# Altium schematic symbol library IC.SchLib: 555 symbols (part 2 of 15) (continued)
## AT25128AN_10SU_1.8 (continued)
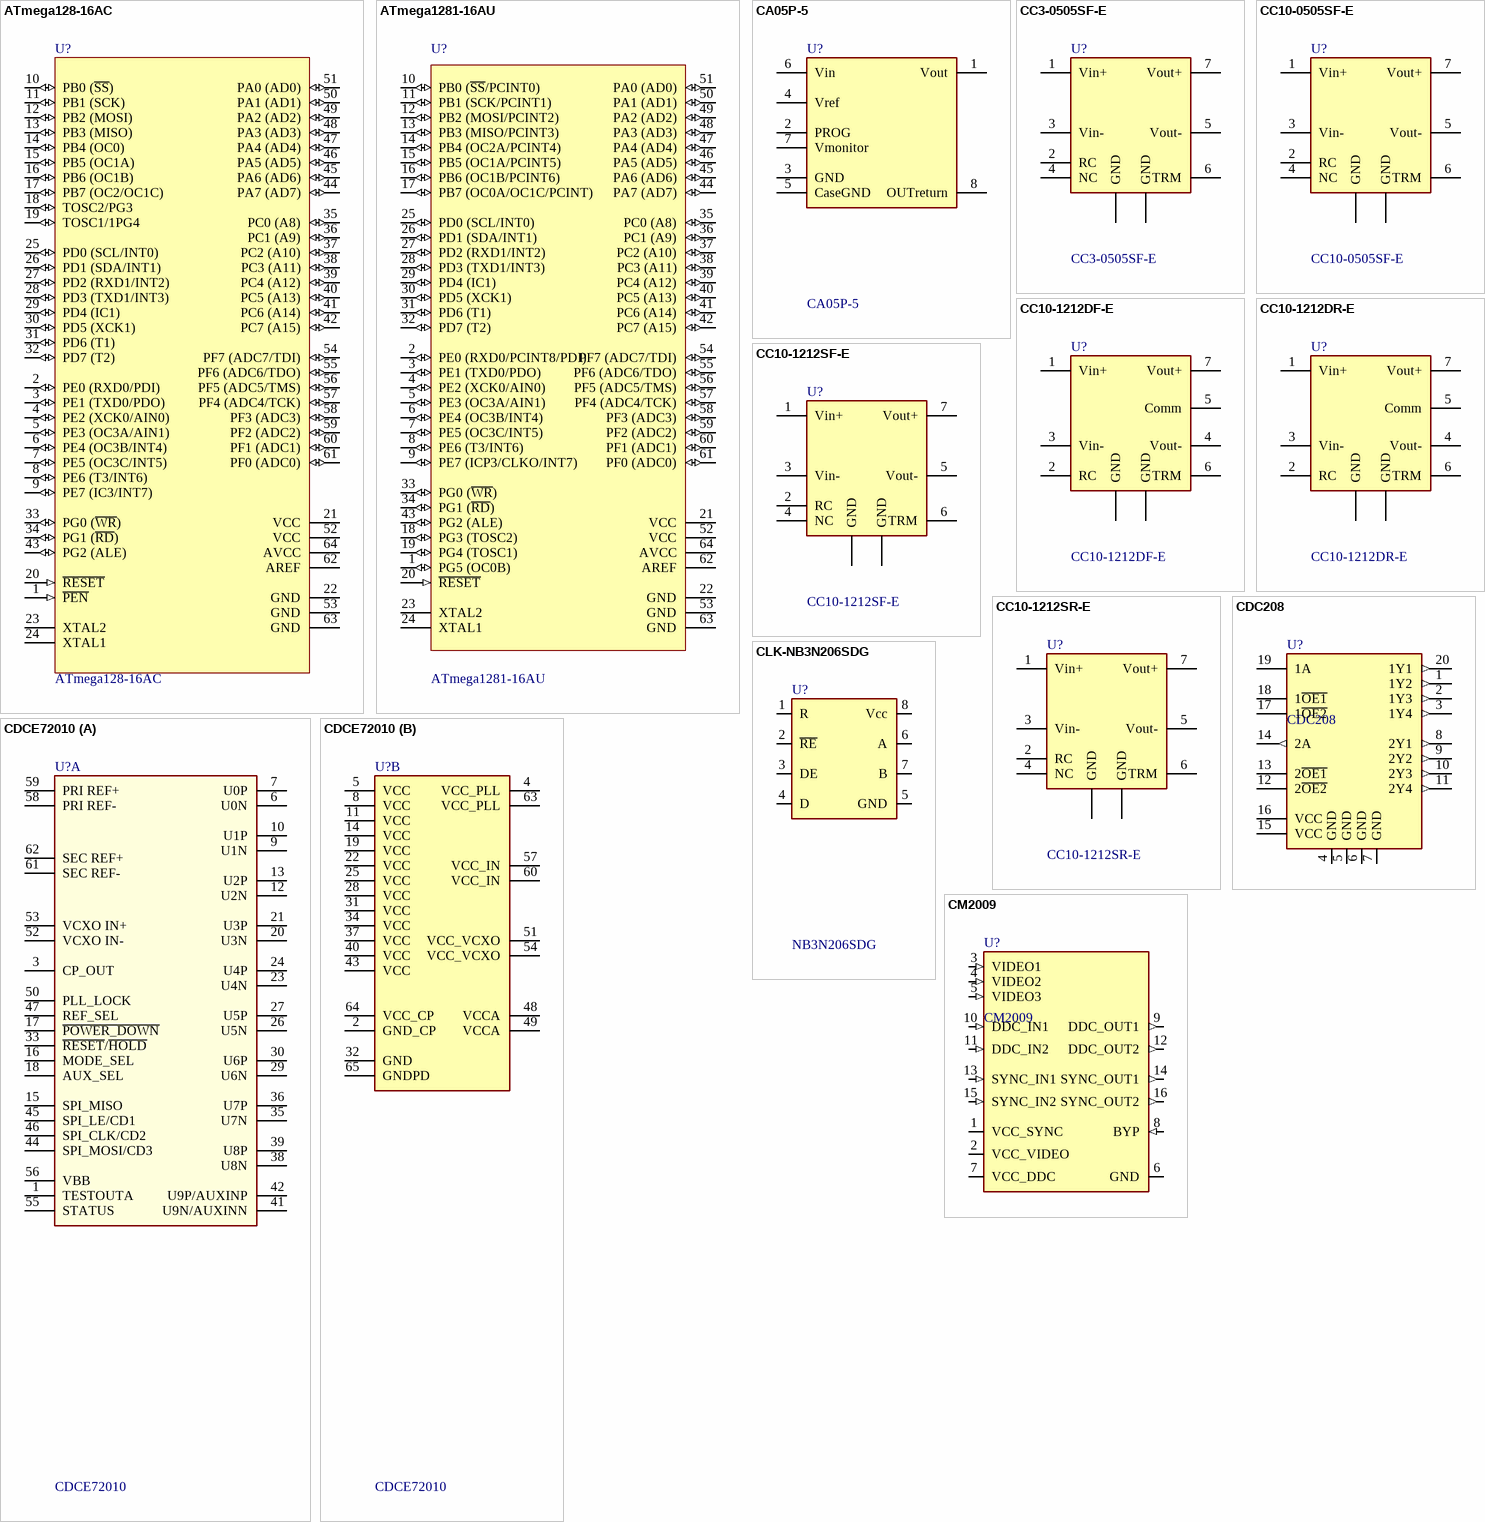
[diagram p8: symbols ATmega128-16AC to CM2009]

## ATmega128-16AC
designator U?
8-Bit AVR Microcontroller with 128K Bytes of In-System Programmable Flash Memory; Manufacturer: Atmel; Sort: 510; Tech: SMDR; Package: TQFP64; Manufacturer No: ATmega128-16AC; Price: 0
3D model ATMEGA128-64A (64-Pin Thin Quad Flat Pack 0.8 mm Pitch)
footprint TQFP64A (TQFP, 64-Leads, Body 16,0x16,0mm (max), Pitch 0,80mm, IPC Medium Density)
pins: 1 ~{PEN} (in), 2 PE0 (RXD0/PDI) (io), 3 PE1 (TXD0/PDO) (io), 4 PE2 (XCK0/AIN0) (io), 5 PE3 (OC3A/AIN1) (io), 6 PE4 (OC3B/INT4) (io), 7 PE5 (OC3C/INT5) (io), 8 PE6 (T3/INT6) (io), 9 PE7 (IC3/INT7) (io), 10 PB0 (~{SS}) (io), 11 PB1 (SCK) (io), 12 PB2 (MOSI) (io), 13 PB3 (MISO) (io), 14 PB4 (OC0) (io), 15 PB5 (OC1A) (io), 16 PB6 (OC1B) (io), 17 PB7 (OC2/OC1C) (io), 18 TOSC2/PG3 (io), 19 TOSC1/1PG4 (io), 20 ~{RESET} (in), 21 VCC (power), 22 GND (power), 23 XTAL2, 24 XTAL1, 25 PD0 (SCL/INT0) (io), 26 PD1 (SDA/INT1) (io), 27 PD2 (RXD1/INT2) (io), 28 PD3 (TXD1/INT3) (io), 29 PD4 (IC1) (io), 30 PD5 (XCK1) (io), 31 PD6 (T1) (io), 32 PD7 (T2) (io), 33 PG0 (~{WR}) (io), 34 PG1 (~{RD}) (io), 35 PC0 (A8) (io), 36 PC1 (A9) (io), 37 PC2 (A10) (io), 38 PC3 (A11) (io), 39 PC4 (A12) (io), 40 PC5 (A13) (io), 41 PC6 (A14) (io), 42 PC7 (A15) (io), 43 PG2 (ALE) (io), 44 PA7 (AD7) (io), 45 PA6 (AD6) (io), 46 PA5 (AD5) (io), 47 PA4 (AD4) (io), 48 PA3 (AD3) (io), 49 PA2 (AD2) (io), 50 PA1 (AD1) (io), 51 PA0 (AD0) (io), 52 VCC (power), 53 GND (power), 54 PF7 (ADC7/TDI) (io), 55 PF6 (ADC6/TDO) (io), 56 PF5 (ADC5/TMS) (io), 57 PF4 (ADC4/TCK) (io), 58 PF3 (ADC3) (io), 59 PF2 (ADC2) (io), 60 PF1 (ADC1) (io), 61 PF0 (ADC0) (io), 62 AREF, 63 GND (power), 64 AVCC (power)

## ATmega1281-16AU
designator U?
8-Bit AVR Microcontroller with 128K Bytes of In-System Programmable Flash Memory; Manufacturer: Atmel; Sort: 510; Tech: SMDR; Package: TQFP64; Manufacturer No: ATmega1281-16AU; Price: 0
3D model ATMEGA128-64A (64-Pin Thin Quad Flat Pack 0.8 mm Pitch)
footprint TQFP64A (TQFP, 64-Leads, Body 16,0x16,0mm (max), Pitch 0,80mm, IPC Medium Density)
pins: 1 PG5 (OC0B) (io), 2 PE0 (RXD0/PCINT8/PDI) (io), 3 PE1 (TXD0/PDO) (io), 4 PE2 (XCK0/AIN0) (io), 5 PE3 (OC3A/AIN1) (io), 6 PE4 (OC3B/INT4) (io), 7 PE5 (OC3C/INT5) (io), 8 PE6 (T3/INT6) (io), 9 PE7 (ICP3/CLKO/INT7) (io), 10 PB0 (~{SS}/PCINT0) (io), 11 PB1 (SCK/PCINT1) (io), 12 PB2 (MOSI/PCINT2) (io), 13 PB3 (MISO/PCINT3) (io), 14 PB4 (OC2A/PCINT4) (io), 15 PB5 (OC1A/PCINT5) (io), 16 PB6 (OC1B/PCINT6) (io), 17 PB7 (OC0A/OC1C/PCINT) (io), 18 PG3 (TOSC2) (io), 19 PG4 (TOSC1) (io), 20 ~{RESET} (in), 21 VCC (power), 22 GND (power), 23 XTAL2, 24 XTAL1, 25 PD0 (SCL/INT0) (io), 26 PD1 (SDA/INT1) (io), 27 PD2 (RXD1/INT2) (io), 28 PD3 (TXD1/INT3) (io), 29 PD4 (IC1) (io), 30 PD5 (XCK1) (io), 31 PD6 (T1) (io), 32 PD7 (T2) (io), 33 PG0 (~{WR}) (io), 34 PG1 (~{RD}) (io), 35 PC0 (A8) (io), 36 PC1 (A9) (io), 37 PC2 (A10) (io), 38 PC3 (A11) (io), 39 PC4 (A12) (io), 40 PC5 (A13) (io), 41 PC6 (A14) (io), 42 PC7 (A15) (io), 43 PG2 (ALE) (io), 44 PA7 (AD7) (io), 45 PA6 (AD6) (io), 46 PA5 (AD5) (io), 47 PA4 (AD4) (io), 48 PA3 (AD3) (io), 49 PA2 (AD2) (io), 50 PA1 (AD1) (io), 51 PA0 (AD0) (io), 52 VCC (power), 53 GND (power), 54 PF7 (ADC7/TDI) (io), 55 PF6 (ADC6/TDO) (io), 56 PF5 (ADC5/TMS) (io), 57 PF4 (ADC4/TCK) (io), 58 PF3 (ADC3) (io), 59 PF2 (ADC2) (io), 60 PF1 (ADC1) (io), 61 PF0 (ADC0) (io), 62 AREF, 63 GND (power), 64 AVCC (power)

## CA05P-5
designator U?
Precision Regulated, Low Ripple, High Voltage Power Supply; Manufacturer: Emco; Sort: 510; Tech: THDW; Manufacturer No: CA05P-5; Price: 0
footprint CA05N-5
pins: 1 Vout, 2 PROG, 3 GND, 4 Vref, 5 CaseGND, 6 Vin, 7 Vmonitor, 8 OUTreturn

## CC3-0505SF-E
designator U?
Ultra Compact, 1.5W to 25W Single and Dual DC-DC Converters; Manufacturer: TDK-Lambda; Comment2: 4.5-9V Vin, 4.75-6.0 VDC, 3W; Sort: 510; Tech: TMDW; Manufacturer No: CC3-0505SF-E; Package: SIPCC3; Price: 0
footprint CC3-F-E(DIP) (CC3-F-E, DIP 11pin, Body 22.86x16.6x8.5mm (LxWxH), R2.54mm)
pins: 1 Vin+ (power), 2 RC, 3 Vin- (power), 4 NC, 5 Vout- (power), 6 TRM, 7 Vout+ (power), MH1 GND, MH2 GND

## CC10-0505SF-E
designator U?
Ultra Compact, 1.5W to 25W Single and Dual DC-DC Converters; Manufacturer: TDK-Lambda; Comment2: 4.5-9V Vin, 4.75-6.0 VDC, 10W; Sort: 510; Tech: TMDW; Manufacturer No: CC10-0505SF-E; Package: SIPCC10; Price: 0
footprint CC10-F-E(DIP) (CC3-F-E, DIP 11pin, Body 35.56x22.6x8.5mm (LxWxH), R5.08mm)
pins: 1 Vin+ (power), 2 RC, 3 Vin- (power), 4 NC, 5 Vout- (power), 6 TRM, 7 Vout+ (power), MH1 GND, MH2 GND

## CC10-1212DF-E
designator U?
Ultra Compact, 1.5W to 25W Single and Dual DC-DC Converters; Manufacturer: TDK-Lambda; Comment2: 12V Vin, +-12/15 VDC, 10W; Sort: 510; Tech: TMDW; Manufacturer No: CC10-1212DF-E; Package: SIPCC10; Price: 0
footprint CC10-F-E(DIP) (CC3-F-E, DIP 11pin, Body 35.56x22.6x8.5mm (LxWxH), R5.08mm)
pins: 1 Vin+ (power), 2 RC, 3 Vin- (power), 4 Vout-, 5 Comm (power), 6 TRM, 7 Vout+ (power), MH1 GND, MH2 GND

## CC10-1212DR-E
designator U?
Ultra Compact, 1.5W to 25W Single and Dual DC-DC Converters; Manufacturer: TDK-Lambda; Manufacturer No: CC10-1212DF-E; Comment2: 12V Vin, +-12/15 VDC, 10W; Sort: 510; Tech: TMDW; Package: SIPCC10; Price: 0
footprint CC10-F-E(SMD) (CC3-F-E, DIP 11pin, Body 35.56x22.6x8.5mm (LxWxH), R5.08mm)
pins: 1 Vin+ (power), 2 RC, 3 Vin- (power), 4 Vout-, 5 Comm (power), 6 TRM, 7 Vout+ (power), MH1 GND, MH2 GND

## CC10-1212SF-E
designator U?
Ultra Compact, 1.5W to 25W Single and Dual DC-DC Converters; Manufacturer: TDK-Lambda; Comment2: 12V Vin, 12 VDC, 10W; Sort: 510; Tech: TMDW; Manufacturer No: CC10-1212SF-E; Package: SIPCC10; Price: 0
footprint CC10-F-E(DIP) (CC3-F-E, DIP 11pin, Body 35.56x22.6x8.5mm (LxWxH), R5.08mm)
pins: 1 Vin+ (power), 2 RC, 3 Vin- (power), 4 NC, 5 Vout- (power), 6 TRM, 7 Vout+ (power), MH1 GND, MH2 GND

## CC10-1212SR-E
designator U?
Ultra Compact, 1.5W to 25W Single and Dual DC-DC Converters; Manufacturer: TDK-Lambda; Comment2: 12V Vin, 12 VDC, 10W; Sort: 510; Tech: TMDW; Manufacturer No: CC10-1212SR-E; Package: SIPCC10; Price: 0
footprint CC10-F-E(SMD) (CC3-F-E, DIP 11pin, Body 35.56x22.6x8.5mm (LxWxH), R5.08mm)
pins: 1 Vin+ (power), 2 RC, 3 Vin- (power), 4 NC, 5 Vout- (power), 6 TRM, 7 Vout+ (power), MH1 GND, MH2 GND

## CDC208
designator U?
Dual 1-Line to 4-Line Clock Driver with 3_state Outputs; Manufacturer: Texas Instruments; Manufacturer No: CDC208DWG4; Sort: 510; Tech: SMDR; Package: SOIC20; Price: 0
footprint SOIC20N (SOIC20, Body 12,9x7,6mm, R1,27mm, IPC Medium Density)
pins: 1 1Y2 (out), 2 1Y3 (out), 3 1Y4 (out), 4 GND (power), 5 GND (power), 6 GND (power), 7 GND (power), 8 2Y1 (out), 9 2Y2 (out), 10 2Y3 (out), 11 2Y4 (out), 12 2~{OE2}, 13 2~{OE1}, 14 2A (out), 15 VCC (power), 16 VCC (power), 17 1~{OE2}, 18 1~{OE1}, 19 1A, 20 1Y1 (out)

## CDCE72010
designator U?
Ten Output High Performance Clock Synchronizer, Jitter Cleaner, and Clock Distributor: QFN64; Manufacturer No: CDCE72010RGCT; Manufacturer: Texas Instruments; Sort: 510; Tech: SMDR; Package: QFN64; Price: 0
footprint QFN64N (QFN, 64-Leads, Body 9,0x9,0mm (max), Pitch 0,50mm, IPC Medium Density)
part A pins: 1 TESTOUTA, 3 CP_OUT, 6 U0N, 7 U0P, 9 U1N, 10 U1P, 12 U2N, 13 U2P, 15 SPI_MISO, 16 MODE_SEL, 17 ~{POWER_DOWN}, 18 AUX_SEL, 20 U3N, 21 U3P, 23 U4N, 24 U4P, 26 U5N, 27 U5P, 29 U6N, 30 U6P, 33 ~{RESET}/~{HOL}~{D}, 35 U7N, 36 U7P, 38 U8N, 39 U8P, 41 U9N/AUXINN, 42 U9P/AUXINP, 44 SPI_MOSI/CD3, 45 SPI_LE/CD1, 46 SPI_CLK/CD2, 47 REF_SEL, 50 PLL_LOCK, 52 VCXO IN-, 53 VCXO IN+, 55 STATUS, 56 VBB, 58 PRI REF-, 59 PRI REF+, 61 SEC REF-, 62 SEC REF+
part B pins: 2 GND_CP (power), 4 VCC_PLL (power), 5 VCC (power), 8 VCC (power), 11 VCC (power), 14 VCC (power), 19 VCC (power), 22 VCC (power), 25 VCC (power), 28 VCC (power), 31 VCC (power), 32 GND (power), 34 VCC (power), 37 VCC (power), 40 VCC (power), 43 VCC (power), 48 VCCA (power), 49 VCCA (power), 51 VCC_VCXO (power), 54 VCC_VCXO (power), 57 VCC_IN (power), 60 VCC_IN (power), 63 VCC_PLL (power), 64 VCC_CP (power), 65 GNDPD (power)

## CLK-NB3N206SDG
designator U?, comment NB3N206SDG
3.3 V Differential Multipoint  Low Voltage M-LVDS Driver  Receiver; Manufacturer: ON Semiconductor; Comment2: 200Mhz, M-LVDS; Sort: 510; Tech: SMDR; Manufacturer No: NB3N206SDG; Package: SOIC-8; Price: 2.39; Supplier: Digi-Key; Supplier No: NB3N206SDGOS-ND
footprint SOIC8-1
pins: 1 R, 2 ~{RE}, 3 DE, 4 D, 5 GND, 6 A, 7 B, 8 Vcc

## CM2009
designator U?
Low Capacitance TSVGA Port Companion Circuit; Manufacturer: CMD; Manufacturer No: CM2009-00QR; Sort: 510; Tech: SMDR; Package: QSOP16; Price: 0
footprint QSOP16 (SSOP; 16 Leads; Body Width 3.9 mm; Pitch 0.635 mm)
pins: 1 VCC_SYNC (power), 2 VCC_VIDEO (power), 3 VIDEO1 (in), 4 VIDEO2 (in), 5 VIDEO3 (in), 6 GND (power), 7 VCC_DDC (power), 8 BYP (in), 9 DDC_OUT1 (out), 10 DDC_IN1 (in), 11 DDC_IN2 (in), 12 DDC_OUT2 (out), 13 SYNC_IN1 (in), 14 SYNC_OUT1 (out), 15 SYNC_IN2 (in), 16 SYNC_OUT2 (out)

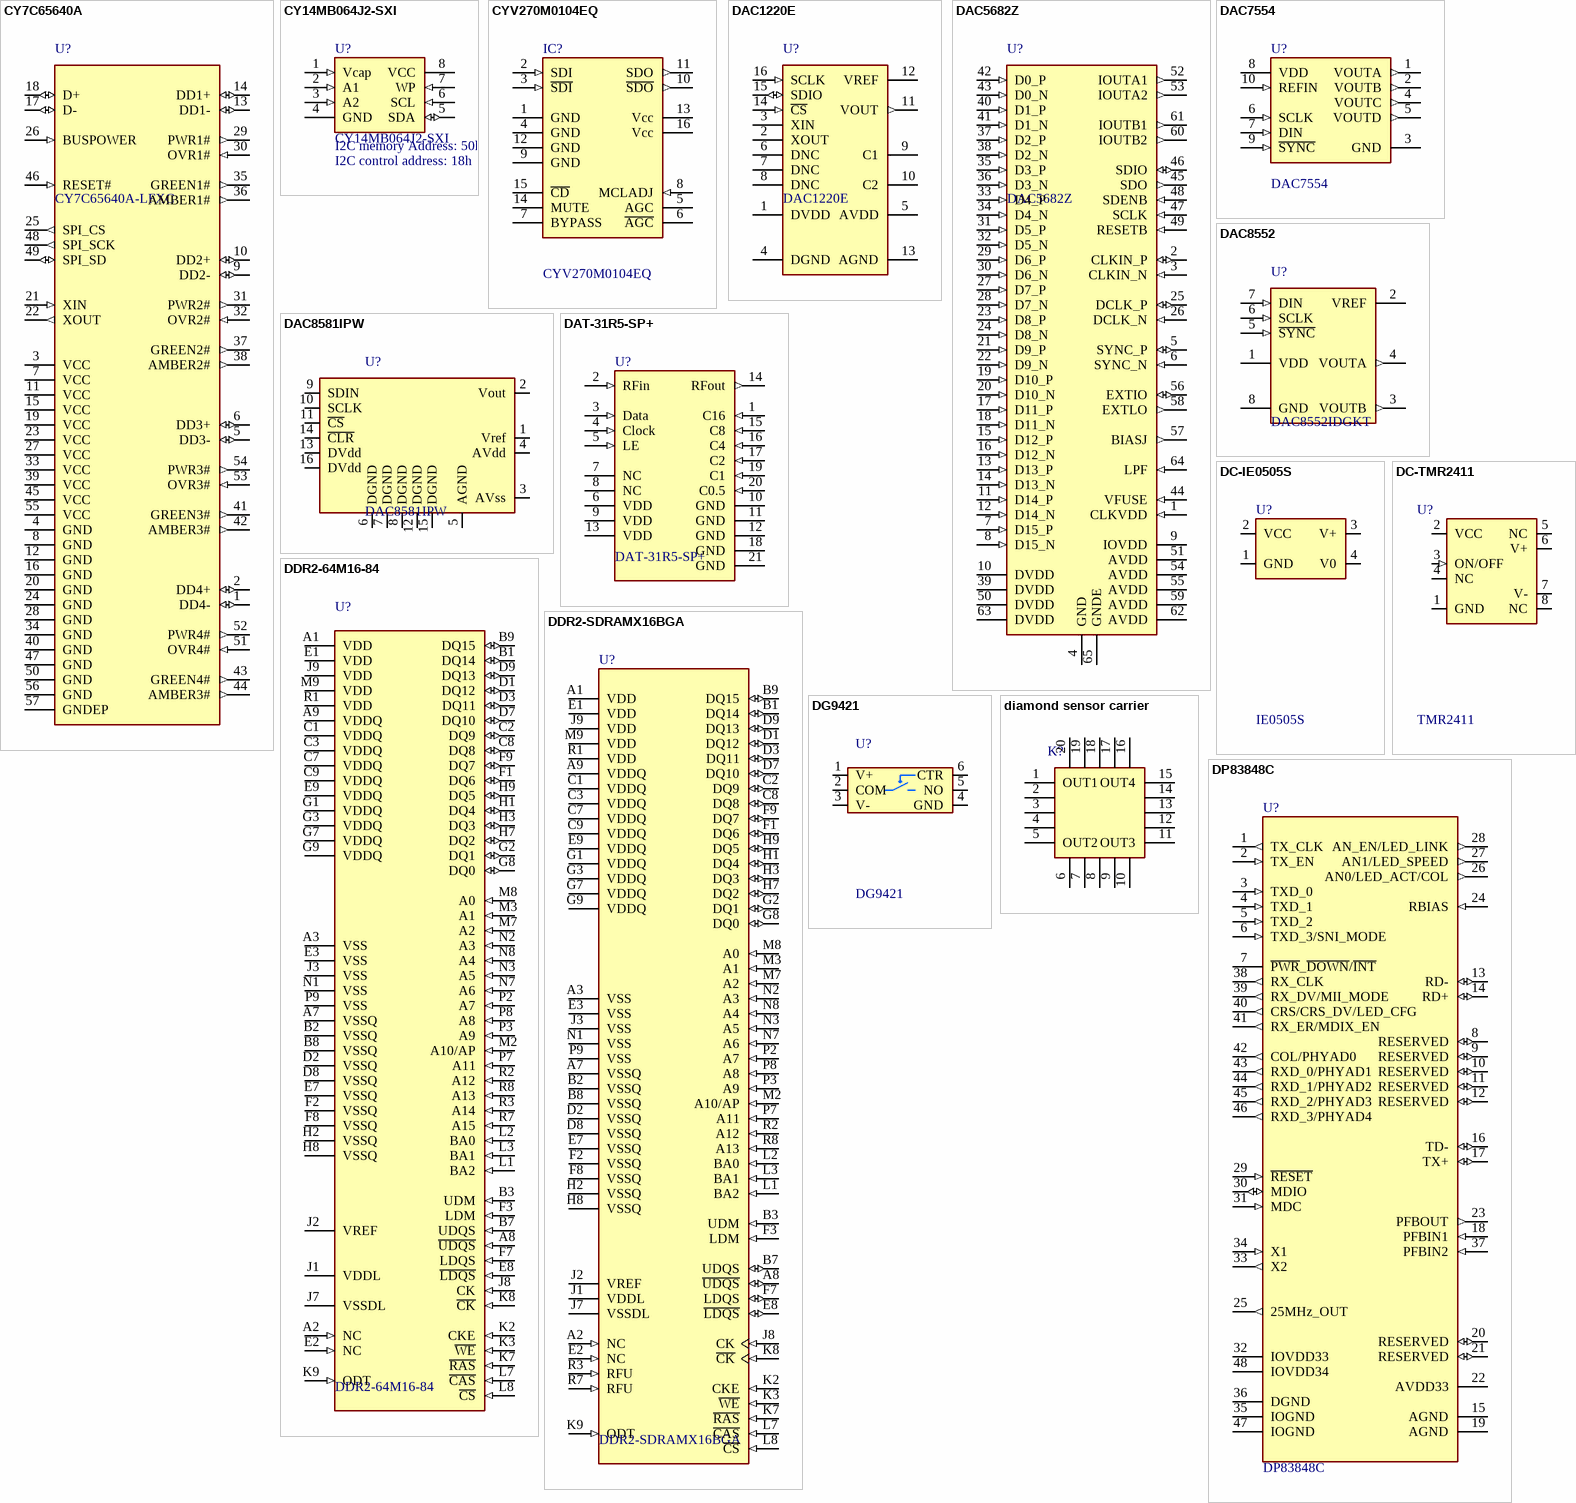
[diagram p9: symbols CY7C65640A to DP83848C]

## CY7C65640A
designator U?, comment CY7C65640A-LFXC
4ch USB 2.0  HUB Controller; Manufacturer: Cypress; Comment2: 3.3V; Sort: 510; Tech: SMDR; Manufacturer No: CY7C65640A-LFXC; Package: QFN56; Price: 12
footprint QFN50P800X800X100-56N (QFN, 56-Leads, Body 8,0x8,0mm (max), Pitch 0,50mm, IPC Medium Density)
pins: 1 DD4- (io), 2 DD4+ (io), 3 VCC (power), 4 GND (power), 5 DD3- (io), 6 DD3+ (io), 7 VCC (power), 8 GND (power), 9 DD2- (io), 10 DD2+ (io), 11 VCC (power), 12 GND (power), 13 DD1- (io), 14 DD1+ (io), 15 VCC (power), 16 GND (power), 17 D- (io), 18 D+ (io), 19 VCC (power), 20 GND (power), 21 XIN (in), 22 XOUT (out), 23 VCC (power), 24 GND (power), 25 SPI_CS (out), 26 BUSPOWER (in), 27 VCC (power), 28 GND (power), 29 PWR1# (out), 30 OVR1# (in), 31 PWR2# (out), 32 OVR2# (in), 33 VCC (power), 34 GND (power), 35 GREEN1# (out), 36 AMBER1# (out), 37 GREEN2# (out), 38 AMBER2# (out), 39 VCC (power), 40 GND (power), 41 GREEN3# (out), 42 AMBER3# (out), 43 GREEN4# (out), 44 AMBER3# (out), 45 VCC (power), 46 RESET# (in), 47 GND (power), 48 SPI_SCK (out), 49 SPI_SD (io), 50 GND (power), 51 OVR4# (in), 52 PWR4# (out), 53 OVR3# (in), 54 PWR3# (out), 55 VCC (power), 56 GND (power), 57 GNDEP (power)

## CY14MB064J2-SXI
designator U?  I2C control address: 18h  I2C memory Address: 50h
NVSRAM 8kByte I2C 2.7-3.6V SOIC8 - need storage Cap; Manufacturer: Cypress; Comment2: 2.7..3.6Vcc I2C 64kbit; Sort: 510; Tech: SMDR; Manufacturer No: CY14MB064J2-SXI; Package: SOIC8; Price: 0
signal-integrity model Model Name (Model Description)
footprint SOIC8-1
pins: 1 Vcap (in), 2 A1 (in), 3 A2 (in), 4 GND (power), 5 SDA (io), 6 SCL (in), 7 WP (in), 8 VCC (power)

## CYV270M0104EQ
designator IC?
SMPTE 259M Adaptive Video Cable Equalizer; Manufacturer No: CYV270M0104EQ-LXC; Manufacturer: Cypress; Tech: SMDR; Sort: 510; Package: SQB16A
footprint SQB16A (QFN, 16-Leads, Body 4,1x4,1mm (max), Pitch 0,65mm, IPC Medium Density)
pins: 1 GND (power), 2 SDI (in), 3 ~{SDI} (in), 4 GND (power), 5 AGC, 6 ~{AGC}, 7 BYPASS, 8 MCLADJ (in), 9 GND (power), 10 ~{SDO} (out), 11 SDO (out), 12 GND (power), 13 Vcc (power), 14 MUTE, 15 ~{CD}, 16 Vcc (power)

## DAC1220E
designator U?
20-Bit, Low-Power  Digital-to-Analog Converter SSOP16; Manufacturer: Texas Instruments; Sort: 510; Tech: SMDR; Manufacturer No: DAC1220E; Package: SSOP16; Price: 0
footprint SSOP16 (SSOP 16-Leads, Body 5,0x4,0mm (max), Pitch 0,63mm, IPC Medium Density)
pins: 1 DVDD (power), 2 XOUT, 3 XIN, 4 DGND (power), 5 AVDD (power), 6 DNC, 7 DNC, 8 DNC, 9 C1, 10 C2, 11 VOUT (out), 12 VREF, 13 AGND (power), 14 ~{CS} (in), 15 SDIO (io), 16 SCLK (in)

## DAC5682Z
designator U?
16-Bit, 1.0 GSPS 2x-4x Interpolating Dual-Channel  Digital-to-Analog Converter VQFN64; Manufacturer: Texas Instruments; Manufacturer No: DAC5682ZIRGCT; Comment2: 16bit, 1GSPS; Sort: 510; Tech: SMDR; Package: QFN64; Price: 0
footprint QFN64N (QFN, 64-Leads, Body 9,0x9,0mm (max), Pitch 0,50mm, IPC Medium Density)
pins: 1 CLKVDD (in), 2 CLKIN_P (io), 3 CLKIN_N (in), 4 GND (power), 5 SYNC_P (io), 6 SYNC_N (in), 7 D15_P (in), 8 D15_N (in), 9 IOVDD (power), 10 DVDD (power), 11 D14_P (in), 12 D14_N (in), 13 D13_P (in), 14 D13_N (in), 15 D12_P (in), 16 D12_N (in), 17 D11_P (in), 18 D11_N (in), 19 D10_P (in), 20 D10_N (in), 21 D9_P (in), 22 D9_N (in), 23 D8_P (in), 24 D8_N (in), 25 DCLK_P (io), 26 DCLK_N (in), 27 D7_P (in), 28 D7_N (in), 29 D6_P (in), 30 D6_N (in), 31 D5_P (in), 32 D5_N (in), 33 D4_P (in), 34 D4_N (in), 35 D3_P (in), 36 D3_N (in), 37 D2_P (in), 38 D2_N (in), 39 DVDD (power), 40 D1_P (in), 41 D1_N (in), 42 D0_P (in), 43 D0_N (in), 44 VFUSE (in), 45 SDO (out), 46 SDIO (io), 47 SCLK (in), 48 SDENB (in), 49 RESETB (in), 50 DVDD (power), 51 AVDD (power), 52 IOUTA1 (out), 53 IOUTA2 (out), 54 AVDD (power), 55 AVDD (power), 56 EXTIO (io), 57 BIASJ (out), 58 EXTLO (out), 59 AVDD (power), 60 IOUTB2 (out), 61 IOUTB1 (out), 62 AVDD (power), 63 DVDD (power), 64 LPF (in), 65 GNDE (power)

## DAC7554
designator U?
DAC 12bit 4channel; Manufacturer: Texas; Manufacturer No: DAC7554IDGS; Comment2: 2.7-5.5V; Sort: 510; Tech: SMDR; Package: MSOP10; Price: 0
footprint SOIC14-1 (Small IC 14 pin)
footprint MSOP10-1 (MSOP 10pin 3x3mm R0.5mm)
pins: 1 VOUTA (out), 2 VOUTB (out), 3 GND (power), 4 VOUTC (out), 5 VOUTD (out), 6 SCLK (in), 7 DIN (in), 8 VDD (power), 9 ~{SYNC} (in), 10 REFIN (in)

## DAC8552
designator U?, comment DAC8552IDGKT
DAC 16bit, dual channel, ultra low glitch, voltage output; Manufacturer: Texas Instruments; Comment2: 2.7..5.5V; Sort: 510; Tech: SMDR; Manufacturer No: DAC8552IDGKT; Package: TSSOP8; Price: 0
footprint TSSOP8 (TSSOP8 3x3mm R0.65mm)
pins: 1 VDD (power), 2 VREF, 3 VOUTB (out), 4 VOUTA (out), 5 ~{SYNC} (in), 6 SCLK (in), 7 DIN (in), 8 GND (power)

## DAC8581IPW
designator U?
16-BIT, HIGH-SPEED, LOW-NOISE, VOLTAGE OUTPUT,  DIGITAL-TO-ANALOG CONVERTER; Manufacturer: Texas Instruments, Farnell, Digi-Key, Mouser; Manufacturer No: DAC8581IPW, 1754810, 296-18312-5-ND, 595-DAC8581IPW; Comment2: -5V to +5V; Sort: 510; Tech: SMDR; Package: TSSOP8; Price: 0
footprint TSSOP16 (TSSOP16 5x4.4mm R0.65mm)
pins: 1 Vref, 2 Vout, 3 AVss, 4 AVdd, 5 AGND, 6 DGND, 7 DGND, 8 DGND, 9 SDIN, 10 SCLK, 11 ~{CS}, 12 DGND, 13 DVdd, 14 ~{CLR}, 15 DGND, 16 DVdd

## DAT-31R5-SP+
designator U?
Digital step attenuator 6bit DC - 2.4 GHz; Manufacturer: Minicircuits; Comment2: +3Vcc, 0.5dB step; Sort: 510; Tech: SMDR; Manufacturer No: DAT-31R5-SP+; Price: 0
footprint DG983-1 (QFN, 20-Leads, Body 4,0x4,0mm (max), Pitch 0,50mm, IPC Medium Density)
pins: 1 C16 (in), 2 RFin (in), 3 Data (in), 4 Clock (in), 5 LE (in), 6 VDD (power), 7 NC, 8 NC, 9 VDD (power), 10 GND (power), 11 GND (power), 12 GND (power), 13 VDD (power), 14 RFout (out), 15 C8 (in), 16 C4 (in), 17 C2 (in), 18 GND (power), 19 C1 (in), 20 C0.5 (in), 21 GND (power)

## DC-IE0505S
designator U?, comment IE0505S
DC/DC converter unregulated; Manufacturer: XP Power, Farnell; Manufacturer No: IE0505S, 8727694; Comment2: 1W, 5V/5V; Sort: 550; Tech: SMDR; Package: SIP-4; Price: 0
footprint SIP-4 (SIP 4 pin, Body 11.68x6.0x9.65mm (LxWxH), Pitch 2,54mm)
footprint SIP-4L (SIP 4 pin, Body 11.68x6.0x9.65mm (LxWxH), Pitch 2,54mm)
pins: 1 GND (power), 2 VCC (power), 3 V+ (power), 4 V0 (power)

## DC-TMR2411
designator U?, comment TMR2411
DC/DC converter regulated; Manufacturer: Traco; Comment2: 1W, 18-36V/5V; Sort: 550; Tech: SMDR; Manufacturer No: TMR2411; Package: SIP-8; Price: 0
footprint SIP-8 (SIP 8pin, Body 21.8x9.2x11.1mm (LxWxH), R2,54mm)
footprint SIP-4L (SIP 4 pin, Body 11.68x6.0x9.65mm (LxWxH), Pitch 2,54mm)
pins: 1 GND (power), 2 VCC (power), 3 ON/OFF (in), 4 NC, 5 NC, 6 V+ (power), 7 V- (power), 8 NC

## DDR2-64M16-84
designator U?
1Gb Synchronous High-Speed CMOS DRAM, 64Mb x 16Bit x 16 Banks, 84-Ball FPGA, Commercial; Manufacturer: Micron, Hynix; Manufacturer No: MT47H64M16HR25:G-XYZ, MT47H64M16HR03, HY5PS1G1631CF_Y5; Sort: 510; Tech: SMDR; Package: BGA84
footprint FBGA84DDR2 (BGA, 84-Leads, Body 14,0x11,5mm,  Pitch 0,80mm)
pins: A1 VDD (power) "Power Supply", A2 NC (in), A3 VSS (power) "Ground", A7 VSSQ (power) "DQ Ground", A8 ~{UDQS} (in) "Data Strobe for DQ8-DQ15", A9 VDDQ (power) "DQ Power", B1 DQ14 (io) "Data Input/Output 14", B2 VSSQ (power) "DQ Ground", B3 UDM (in) "Input/Output Mask for DQ8-DQ15", B7 UDQS (in) "Data Strobe for DQ8-DQ15", B8 VSSQ (power) "DQ Ground", B9 DQ15 (io) "Data Input/Output 15", C1 VDDQ (power) "DQ Power", C2 DQ9 (io) "Data Input/Output 9", C3 VDDQ (power) "DQ Power", C7 VDDQ (power) "DQ Power", C8 DQ8 (io) "Data Input/Output 8", C9 VDDQ (power) "DQ Power", D1 DQ12 (io) "Data Input/Output 12", D2 VSSQ (power) "DQ Ground", D3 DQ11 (io) "Data Input/Output 11", D7 DQ10 (io) "Data Input/Output 10", D8 VSSQ (power) "DQ Ground", D9 DQ13 (io) "Data Input/Output 13", E1 VDD (power) "Power Supply", E2 NC (in), E3 VSS (power) "Ground", E7 VSSQ (power) "DQ Ground", E8 ~{LDQS} (in) "Data Strobe for DQ0-DQ7", E9 VDDQ (power) "DQ Power", F1 DQ6 (io) "Data Input/Output 6", F2 VSSQ (power) "DQ Ground", F3 LDM (in) "Input/Output Mask for DQ0-DQ7", F7 LDQS (in) "Data Strobe for DQ0-DQ7", F8 VSSQ (power) "DQ Ground", F9 DQ7 (io) "Data Input/Output 7", G1 VDDQ (power) "DQ Power", G2 DQ1 (io) "Data Input/Output 1", G3 VDDQ (power) "DQ Power", G7 VDDQ (power) "DQ Power", G8 DQ0 (io) "Data Input/Output 0", G9 VDDQ (power) "DQ Power", H1 DQ4 (io) "Data Input/Output 4", H2 VSSQ (power) "DQ Ground", H3 DQ3 (io) "Data Input/Output 3", H7 DQ2 (io) "Data Input/Output 2", H8 VSSQ (power) "DQ Ground", H9 DQ5 (io) "Data Input/Output 5", J1 VDDL (power) "DL Power", J2 VREF (power) "Vref", J3 VSS (power) "Ground", J7 VSSDL (power) "DL Ground", J8 CK (in) "Clock", J9 VDD (power) "Power Supply", K2 CKE (in) "Clock Enable", K3 ~{WE} (in) "Command Input", K7 ~{RAS} (in) "Command Input", K8 ~{CK} (in) "Clock", K9 ODT (in), L1 BA2 (in), L2 BA0 (in) "Bank Address Input 0", L3 BA1 (in) "Bank Address Input 1", L7 ~{CAS} (in) "Command Input", L8 ~{CS} (in) "Chip Select", M2 A10/AP (in) "Address Input 10", M3 A1 (in) "Address Input 1", M7 A2 (in) "Address Input 2", M8 A0 (in) "Address Input 0", M9 VDD (power) "Power Supply", N1 VSS (power) "Ground", N2 A3 (in) "Address Input 3", N3 A5 (in) "Address Input 5", N7 A6 (in) "Address Input 6", N8 A4 (in) "Address Input 4", P2 A7 (in) "Address Input 7", P3 A9 (in) "Address Input 9", P7 A11 (in) "Address Input 11", P8 A8 (in) "Address Input 8", P9 VSS (power) "Ground", R1 VDD (power) "Power Supply", R2 A12 (in) "Address Input 12", R3 A14 (in), R7 A15 (in), R8 A13 (in)

## DDR2-SDRAMX16BGA
designator U?
256Mb Synchronous High-Speed CMOS DRAM, 32Mb x 16Bit x 16 Banks, 84-Ball FPGA, Commercial; Package: BGA84
footprint FBGA92DDR2 (BGA, 84+8-Leads, Body 17,0x10,0mm,  Pitch 0,80mm)
pins: A1 VDD (power) "Power Supply", A2 NC (in), A3 VSS (power) "Ground", A7 VSSQ (power) "DQ Ground", A8 ~{UDQS} (io) "Data Strobe for DQ8-DQ15", A9 VDDQ (power) "DQ Power", B1 DQ14 (io) "Data Input/Output 14", B2 VSSQ (power) "DQ Ground", B3 UDM (in) "Input/Output Mask for DQ8-DQ15", B7 UDQS (io) "Data Strobe for DQ8-DQ15", B8 VSSQ (power) "DQ Ground", B9 DQ15 (io) "Data Input/Output 15", C1 VDDQ (power) "DQ Power", C2 DQ9 (io) "Data Input/Output 9", C3 VDDQ (power) "DQ Power", C7 VDDQ (power) "DQ Power", C8 DQ8 (io) "Data Input/Output 8", C9 VDDQ (power) "DQ Power", D1 DQ12 (io) "Data Input/Output 12", D2 VSSQ (power) "DQ Ground", D3 DQ11 (io) "Data Input/Output 11", D7 DQ10 (io) "Data Input/Output 10", D8 VSSQ (power) "DQ Ground", D9 DQ13 (io) "Data Input/Output 13", E1 VDD (power) "Power Supply", E2 NC (in), E3 VSS (power) "Ground", E7 VSSQ (power) "DQ Ground", E8 ~{LDQS} (io) "Data Strobe for DQ0-DQ7", E9 VDDQ (power) "DQ Power", F1 DQ6 (io) "Data Input/Output 6", F2 VSSQ (power) "DQ Ground", F3 LDM (in) "Input/Output Mask for DQ0-DQ7", F7 LDQS (io) "Data Strobe for DQ0-DQ7", F8 VSSQ (power) "DQ Ground", F9 DQ7 (io) "Data Input/Output 7", G1 VDDQ (power) "DQ Power", G2 DQ1 (io) "Data Input/Output 1", G3 VDDQ (power) "DQ Power", G7 VDDQ (power) "DQ Power", G8 DQ0 (io) "Data Input/Output 0", G9 VDDQ (power) "DQ Power", H1 DQ4 (io) "Data Input/Output 4", H2 VSSQ (power) "DQ Ground", H3 DQ3 (io) "Data Input/Output 3", H7 DQ2 (io) "Data Input/Output 2", H8 VSSQ (power) "DQ Ground", H9 DQ5 (io) "Data Input/Output 5", J1 VDDL (power) "DL Power", J2 VREF (power) "Vref", J3 VSS (power) "Ground", J7 VSSDL (power) "DL Ground", J8 CK (in) "Clock", J9 VDD (power) "Power Supply", K2 CKE (in) "Clock Enable", K3 ~{WE} (in) "Command Input", K7 ~{RAS} (in) "Command Input", K8 ~{CK} (in) "Clock", K9 ODT (in), L1 BA2 (in), L2 BA0 (in) "Bank Address Input 0", L3 BA1 (in) "Bank Address Input 1", L7 ~{CAS} (in) "Command Input", L8 ~{CS} (in) "Chip Select", M2 A10/AP (in) "Address Input 10", M3 A1 (in) "Address Input 1", M7 A2 (in) "Address Input 2", M8 A0 (in) "Address Input 0", M9 VDD (power) "Power Supply", N1 VSS (power) "Ground", N2 A3 (in) "Address Input 3", N3 A5 (in) "Address Input 5", N7 A6 (in) "Address Input 6", N8 A4 (in) "Address Input 4", P2 A7 (in) "Address Input 7", P3 A9 (in) "Address Input 9", P7 A11 (in) "Address Input 11", P8 A8 (in) "Address Input 8", P9 VSS (power) "Ground", R1 VDD (power) "Power Supply", R2 A12 (in) "Address Input 12", R3 RFU (in), R7 RFU (in), R8 A13 (in)

## DG9421
designator U?
Precision Low-Voltage, Low-Glitch CMOS Analog Switches; Manufacturer: Vishay, Farnell; Manufacturer No: DG9421DV-T1-E3, 1469426; Comment2: 2.4..5.5V 10pA 2R Rds; Sort: 510; Tech: SMDR; Package: TSOP6; Price: 0
footprint TSOP95P280X110-6N (TSOP, 6-Leads, Body 3,1x1,7mm (max), Pitch 0,95mm, IPC Medium Density)
pins: 1 V+ (power), 2 COM, 3 V- (power), 4 GND (power), 5 NO, 6 CTR

## diamond sensor carrier
designator K?
footprint carrier (20 Leads; Body Width 8.9mm; Pitch 1.27 mm)
pins: 1 OUT1, 2, 3, 4, 5 OUT2, 6, 7, 8, 9, 10, 11 OUT3, 12, 13, 14, 15 OUT4, 16, 17, 18, 19, 20

## DP83848C
designator U?
Single Port 10/100 Mb/s Ethernet Physical Layer Transceiver; Manufacturer: National Semiconductors; Manufacturer No: DP83848CW; Sort: 510; Tech: SMDR; Package: PQFP-80; Price: 0
footprint TSQFP50P900X900X160-48N (TSQFP, 48-Leads, Body 9,0x9,0mm (max), Pitch 0,50mm, IPC Medium Density)
pins: 1 TX_CLK (out), 2 TX_EN (in), 3 TXD_0 (in), 4 TXD_1 (in), 5 TXD_2 (in), 6 TXD_3/SNI_MODE (in), 7 ~{PWR}_~{DOWN}/~{INT} (oc), 8 RESERVED (io), 9 RESERVED (io), 10 RESERVED (io), 11 RESERVED (io), 12 RESERVED (io), 13 RD- (io), 14 RD+ (io), 15 AGND (power), 16 TD- (io), 17 TX+ (io), 18 PFBIN1 (in), 19 AGND (power), 20 RESERVED (io), 21 RESERVED (io), 22 AVDD33 (power), 23 PFBOUT (out), 24 RBIAS (in), 25 25MHz_OUT (out), 26 AN0/LED_ACT/COL (out), 27 AN1/LED_SPEED (out), 28 AN_EN/LED_LINK (out), 29 ~{RESET} (in), 30 MDIO (io), 31 MDC (in), 32 IOVDD33 (power), 33 X2 (out), 34 X1 (in), 35 IOGND (power), 36 DGND (power), 37 PFBIN2 (in), 38 RX_CLK (out), 39 RX_DV/MII_MODE (out), 40 CRS/CRS_DV/LED_CFG (out), 41 RX_ER/MDIX_EN (out), 42 COL/PHYAD0 (out), 43 RXD_0/PHYAD1 (out), 44 RXD_1/PHYAD2 (out), 45 RXD_2/PHYAD3 (out), 46 RXD_3/PHYAD4 (out), 47 IOGND (power), 48 IOVDD34 (power)

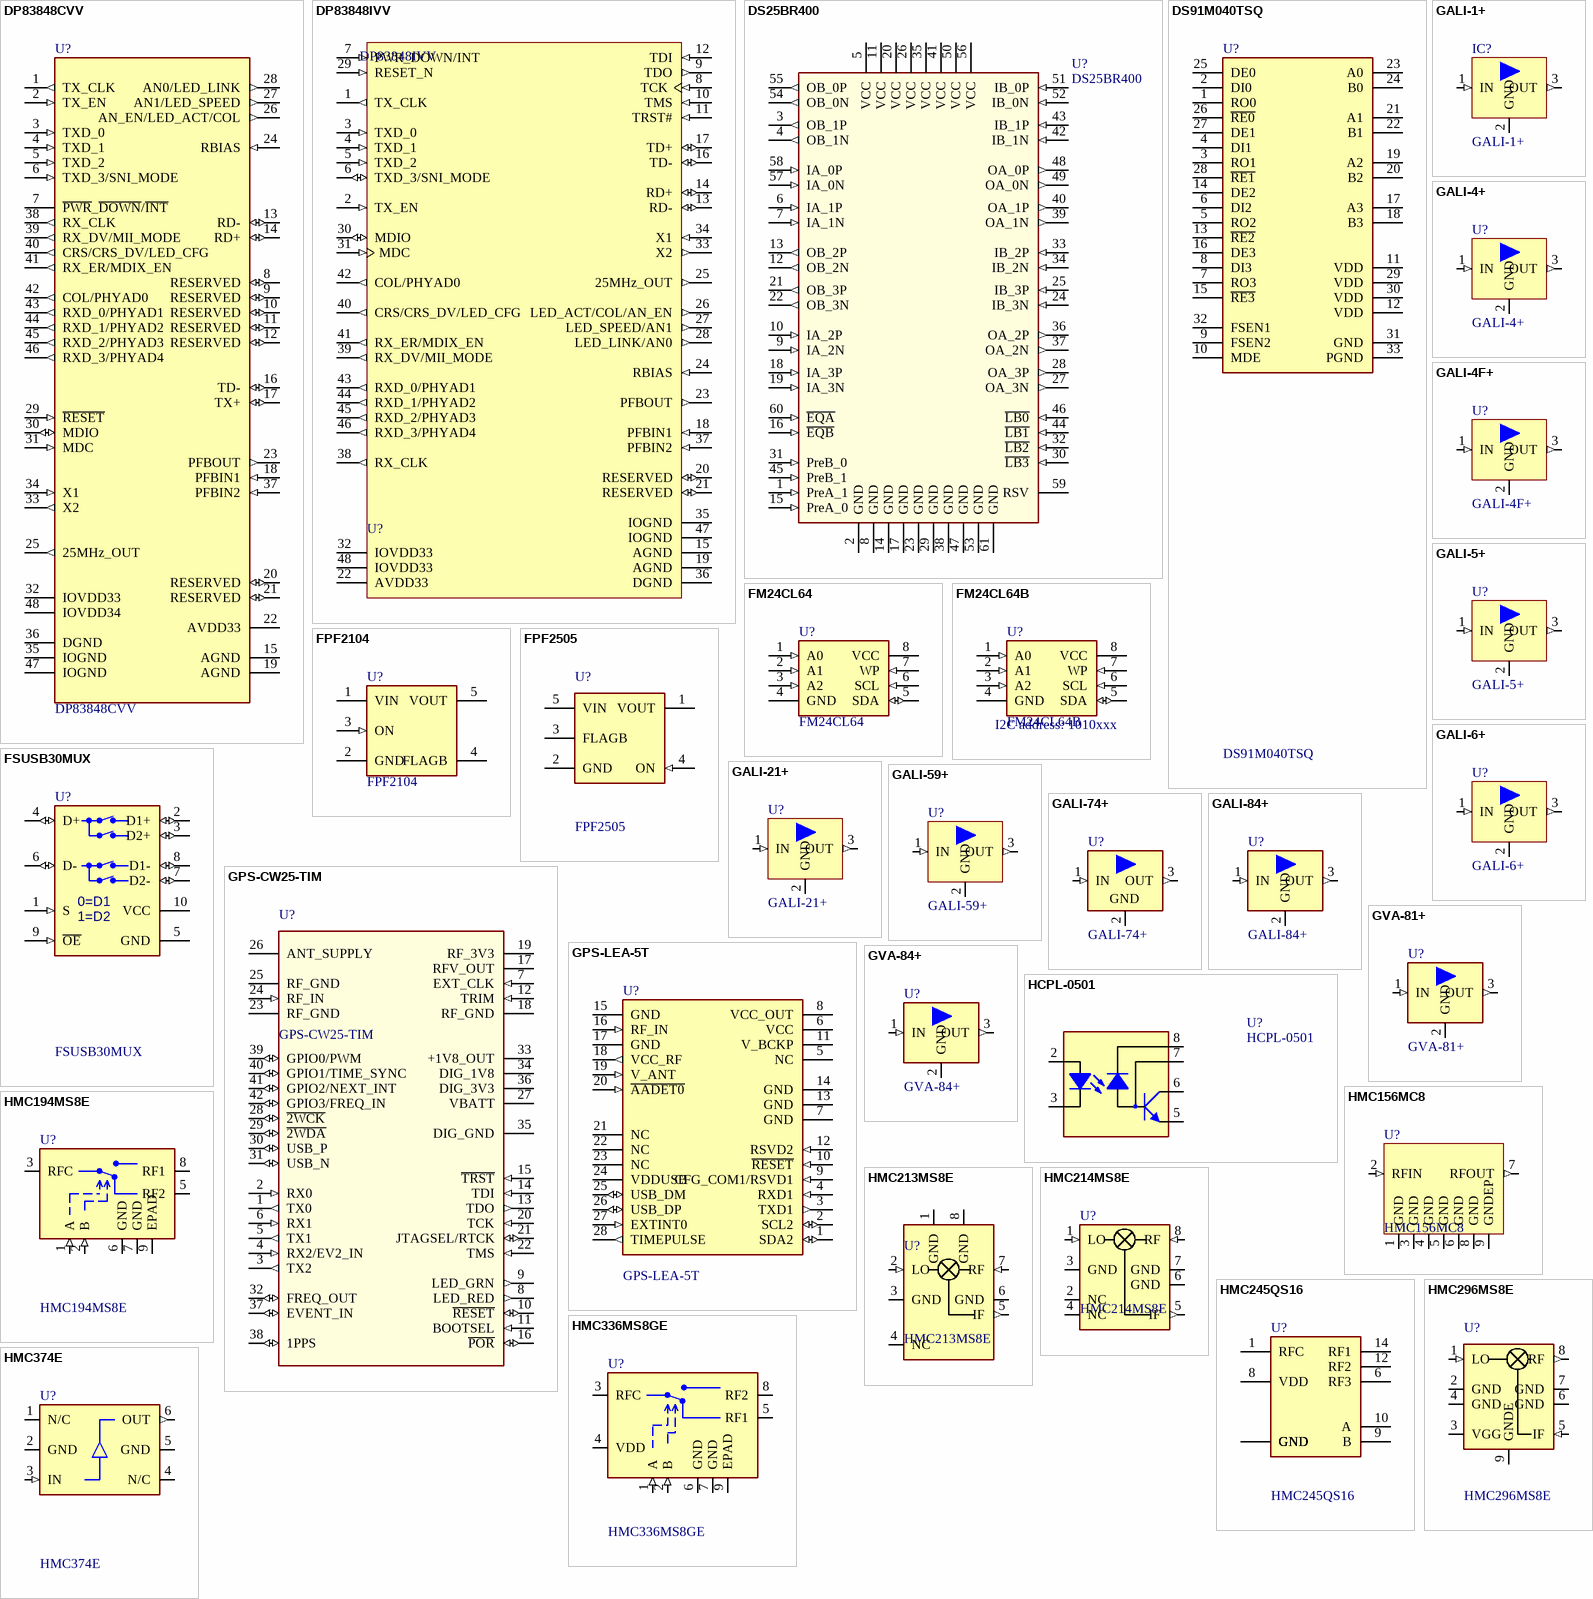
[diagram p10: symbols DP83848CVV to HMC374E]

## DP83848CVV
designator U?
Single Port 10/100 Mb/s Ethernet Physical Layer Transceiver; Manufacturer: National, Farnell; Manufacturer No: DP83848CVV, 1286816; Sort: 510; Tech: SMDR; Package: LQFP48; Price: 4
footprint TSQFP50P900X900X160-48N (TSQFP, 48-Leads, Body 9,0x9,0mm (max), Pitch 0,50mm, IPC Medium Density)
pins: 1 TX_CLK (out), 2 TX_EN (in), 3 TXD_0 (in), 4 TXD_1 (in), 5 TXD_2 (in), 6 TXD_3/SNI_MODE (in), 7 ~{PWR}_~{DOWN}/~{INT} (oc), 8 RESERVED (io), 9 RESERVED (io), 10 RESERVED (io), 11 RESERVED (io), 12 RESERVED (io), 13 RD- (io), 14 RD+ (io), 15 AGND (power), 16 TD- (io), 17 TX+ (io), 18 PFBIN1 (in), 19 AGND (power), 20 RESERVED (io), 21 RESERVED (io), 22 AVDD33 (power), 23 PFBOUT (out), 24 RBIAS (in), 25 25MHz_OUT (out), 26 AN_EN/LED_ACT/COL (out), 27 AN1/LED_SPEED (out), 28 AN0/LED_LINK (out), 29 ~{RESET} (in), 30 MDIO (io), 31 MDC (in), 32 IOVDD33 (power), 33 X2 (out), 34 X1 (in), 35 IOGND (power), 36 DGND (power), 37 PFBIN2 (in), 38 RX_CLK (out), 39 RX_DV/MII_MODE (out), 40 CRS/CRS_DV/LED_CFG (out), 41 RX_ER/MDIX_EN (out), 42 COL/PHYAD0 (out), 43 RXD_0/PHYAD1 (out), 44 RXD_1/PHYAD2 (out), 45 RXD_2/PHYAD3 (out), 46 RXD_3/PHYAD4 (out), 47 IOGND (power), 48 IOVDD34 (power)

## DP83848IVV
designator U?
PHYTER® Industrial Temperature Single Port 10/100 Mb/s Ethernet Physical Layer Transceiver; Manufacturer: National Semiconductor; CompType: Interface IC; PackageTopMarking: NSUZXYTT*DP83848VV*VBI; Published: 4-Dec-2008; DatasheetVersion: Feb-2007; PackageVersion: revE, May-2007; PackageReference: VBH48A; Publisher: Altium Limited; PackageDescription: LQFP, 7 x 7 x 1.4mm, 48 Lead, 0.5mm Pitch; PartNumber: DP83848IVV; RoHS: Y; PinCount: 48; DigiKeyPartNumber: DP83848IVV-ND; ComponentLink1Description: DP83848I Datasheet; ComponentLink1URL: http://www.national.com/ds/DP/DP83848I.pdf; ComponentLink2Description: DP83848I Web Page; ComponentLink2URL: http://www.national.com/pf/DP/DP83848I.html; ComponentLink3Description: VBH48A Package Page; ComponentLink3URL: http://www.national.com/packaging/folders/vbh48a.html
footprint TSQFP50P900X900X160-48N (TSQFP, 48-Leads, Body 9,0x9,0mm (max), Pitch 0,50mm, IPC Medium Density)
pins: 1 TX_CLK (out), 2 TX_EN (in), 3 TXD_0 (in), 4 TXD_1 (in), 5 TXD_2 (in), 6 TXD_3/SNI_MODE (io), 7 PWR_DOWN/INT (in), 8 TCK (in), 9 TDO (out), 10 TMS (in), 11 TRST# (in), 12 TDI (in), 13 RD- (io), 14 RD+ (io), 15 AGND (power), 16 TD- (io), 17 TD+ (io), 18 PFBIN1 (in), 19 AGND (power), 20 RESERVED (io), 21 RESERVED (io), 22 AVDD33 (power), 23 PFBOUT (out), 24 RBIAS (in), 25 25MHz_OUT (out), 26 LED_ACT/COL/AN_EN (out), 27 LED_SPEED/AN1 (out), 28 LED_LINK/AN0 (out), 29 RESET_N (in), 30 MDIO (io), 31 MDC (in), 32 IOVDD33 (power), 33 X2 (out), 34 X1 (in), 35 IOGND (power), 36 DGND (power), 37 PFBIN2 (in), 38 RX_CLK (out), 39 RX_DV/MII_MODE (out), 40 CRS/CRS_DV/LED_CFG (out), 41 RX_ER/MDIX_EN (out), 42 COL/PHYAD0 (out), 43 RXD_0/PHYAD1 (out), 44 RXD_1/PHYAD2 (out), 45 RXD_2/PHYAD3 (out), 46 RXD_3/PHYAD4 (out), 47 IOGND (power), 48 IOVDD33 (power)

## DS25BR400
designator U?
Quad Transceiver with Input Equalization and Output Deemphasis; Manufacturer: National; Manufacturer No: DS25BR400TSQ; Sort: 510; Tech: SMDR; Package: eLLP-60; Price: 0
footprint LLP60 (Leadless 60 pin 9x9x0.8mm R0.5mm)
pins: 1 PreA_1 (in), 2 GND (power), 3 OB_1P (out), 4 OB_1N (out), 5 VCC (power), 6 IA_1P (in), 7 IA_1N (in), 8 GND (power), 9 IA_2N (in), 10 IA_2P (in), 11 VCC (power), 12 OB_2N (out), 13 OB_2P (out), 14 GND (power), 15 PreA_0 (in), 16 ~{EQB} (in), 17 GND (power), 18 IA_3P (in), 19 IA_3N (in), 20 VCC (power), 21 OB_3P (out), 22 OB_3N (out), 23 GND (power), 24 IB_3N (in), 25 IB_3P (in), 26 VCC (power), 27 OA_3N (out), 28 OA_3P (out), 29 GND (power), 30 ~{LB3} (in), 31 PreB_0 (in), 32 ~{LB2} (in), 33 IB_2P (in), 34 IB_2N (in), 35 VCC (power), 36 OA_2P (out), 37 OA_2N (out), 38 GND (power), 39 OA_1N (out), 40 OA_1P (out), 41 VCC (power), 42 IB_1N (in), 43 IB_1P (in), 44 ~{LB1} (in), 45 PreB_1 (in), 46 ~{LB0} (in), 47 GND (power), 48 OA_0P (out), 49 OA_0N (out), 50 VCC (power), 51 IB_0P (in), 52 IB_0N (in), 53 GND (power), 54 OB_0N (out), 55 OB_0P (out), 56 VCC (power), 57 IA_0N (in), 58 IA_0P (in), 59 RSV, 60 ~{EQA} (in), 61 GND (power)

## DS91M040TSQ
designator U?
4ch half-duplex M-LVDS line transceiver; Manufacturer: National Semiconductor; Sort: 510; Tech: SMDR; Manufacturer No: DS91M040TSQ; Package: LLP-32; Price: 0
footprint QFN50P500X500X100-32N (QFN, 32-Leads, Body 5,0x5,0mm (max), Pitch 0,50mm, IPC Medium Density)
pins: 1 RO0, 2 DI0, 3 RO1, 4 DI1, 5 RO2, 6 DI2, 7 RO3, 8 DI3, 9 FSEN2, 10 MDE, 11 VDD, 12 VDD, 13 ~{RE2}, 14 DE2, 15 ~{RE3}, 16 DE3, 17 A3, 18 B3, 19 A2, 20 B2, 21 A1, 22 B1, 23 A0, 24 B0, 25 DE0, 26 ~{RE0}, 27 DE1, 28 ~{RE1}, 29 VDD, 30 VDD, 31 GND, 32 FSEN1, 33 PGND

## FM24CL64
designator U?
NFND; Manufacturer: Ramtron, Farnell; Manufacturer No: FM24CL64-G, 1210795; Comment2: 2.7-3.6Vcc  8K x 8bit; Sort: 510; Tech: SMDR; Package: SOIC8; Price: 3
signal-integrity model Model Name (Model Description)
footprint SOIC8-1
pins: 1 A0 (in), 2 A1 (in), 3 A2 (in), 4 GND (power), 5 SDA (io), 6 SCL (in), 7 WP (in), 8 VCC (power)

## FM24CL64B
designator U?  I2C address: 1010xxx
Ferroelectric Nonvolatile RAM 64K I2C; Manufacturer: Ramtron, Digikey; Manufacturer No: FM24CL64B-G, 1140-1017-1-ND; Comment2: 2.7-3.6Vcc  8K x 8bit; Sort: 510; Tech: SMDR; Package: SOIC8; Price: 3
signal-integrity model Model Name (Model Description)
footprint SOIC8-1
pins: 1 A0 (in), 2 A1 (in), 3 A2 (in), 4 GND (power), 5 SDA (io), 6 SCL (in), 7 WP (in), 8 VCC (power)